# Altium footprint library CONNECTOR HDR.PcbLib: 337 footprints (part 3 of 22)
Each footprint in its own frame and in the unit in brackets; x right, y up, seen from the top. Pads: shape width x height; smd on the part's side, far side on the other; paste and mask are expansions set on the pad; w line width, h text height; cw(c..) or ccw(c..) is an arc to the next point about the centre after c.
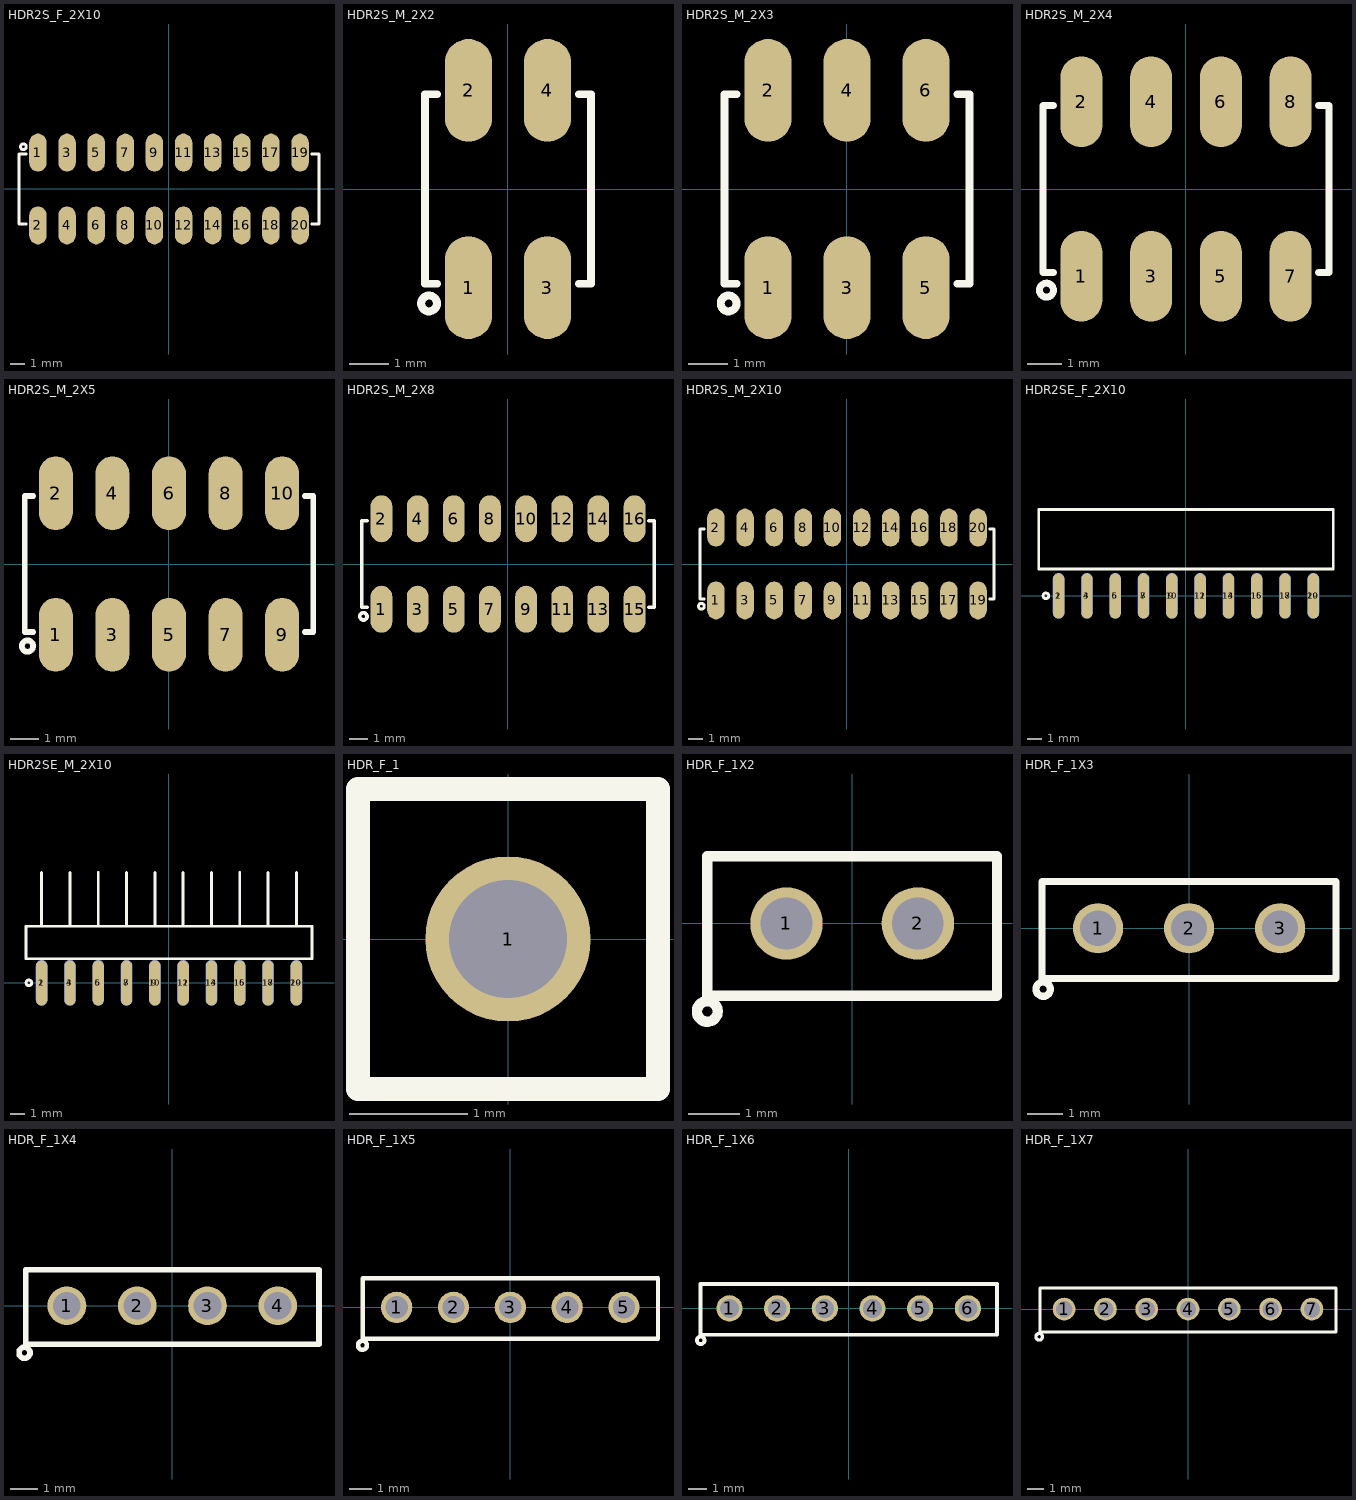
[diagram p2: the footprints below, top view; thin cyan lines are the x and y axes]

## HDR2S_F_2X10 [mm] "Header 2.0mm pitch"
height 1.2
pads (20):
  oval 1.2x2.6 smd mask+0.1: 1(-9,2.5) 2(-9,-2.5) 3(-7,2.5) 4(-7,-2.5) 5(-5,2.5) 6(-5,-2.5) 7(-3,2.5) 8(-3,-2.5) 9(-1,2.5) 10(-1,-2.5) 11(1,2.5) 12(1,-2.5) 13(3,2.5) 14(3,-2.5) 15(5,2.5) 16(5,-2.5) 17(7,2.5) 18(7,-2.5) 19(9,2.5) 20(9,-2.5)
Top Overlay:
  circle w0.2: c-10,2.9 r0.2
  lines w0.2: -9.8,-2.4 -10.3,-2.4 -10.3,2.4 -9.8,2.4 ; 9.8,-2.4 10.3,-2.4 10.3,2.4 9.8,2.4
3D body: height 4.6, standoff 0, extent -10.2,-3.35 10.2,3.351

## HDR2S_M_2X2 [mm] "Header 2.0mm pitch"
pads (4):
  oval 1.2x2.6 smd mask+0.1: 1(-1,-2.5) 2(-1,2.5) 3(1,-2.5) 4(1,2.5)
Top Overlay:
  circle w0.2: c-2,-2.9 r0.2
  lines w0.2: -1.8,-2.4 -2.1,-2.4 -2.1,2.4 -1.8,2.4 ; 1.8,-2.4 2.1,-2.4 2.1,2.4 1.8,2.4
3D body: height 6.5, standoff 0, extent -1.975,-3.25 1.975,3.25

## HDR2S_M_2X3 [mm] "Header 2.0mm pitch"
pads (6):
  oval 1.2x2.6 smd mask+0.1: 1(-2,-2.5) 2(-2,2.5) 3(0,-2.5) 4(0,2.5) 5(2,-2.5) 6(2,2.5)
Top Overlay:
  circle w0.2: c-3,-2.9 r0.2
  lines w0.2: -2.8,-2.4 -3.1,-2.4 -3.1,2.4 -2.8,2.4 ; 2.8,-2.4 3.1,-2.4 3.1,2.4 2.8,2.4
3D body: height 6.5, standoff 0, extent -2.975,-3.25 2.975,3.25

## HDR2S_M_2X4 [mm] "Header 2.0mm pitch"
pads (8):
  oval 1.2x2.6 smd mask+0.1: 1(-3,-2.5) 2(-3,2.5) 3(-1,-2.5) 4(-1,2.5) 5(1,-2.5) 6(1,2.5) 7(3,-2.5) 8(3,2.5)
Top Overlay:
  circle w0.2: c-4,-2.9 r0.2
  lines w0.2: -3.8,-2.4 -4.1,-2.4 -4.1,2.4 -3.8,2.4 ; 3.8,-2.4 4.1,-2.4 4.1,2.4 3.8,2.4
3D body: height 6.5, standoff 0, extent -3.975,-3.25 3.975,3.25

## HDR2S_M_2X5 [mm] "Header 2.0mm pitch"
height 1.2
pads (10):
  oval 1.2x2.6 smd mask+0.1: 1(-4,-2.5) 2(-4,2.5) 3(-2,-2.5) 4(-2,2.5) 5(0,-2.5) 6(0,2.5) 7(2,-2.5) 8(2,2.5) 9(4,-2.5) 10(4,2.5)
Top Overlay:
  circle w0.2: c-5,-2.9 r0.2
  lines w0.2: -4.8,-2.4 -5.1,-2.4 -5.1,2.4 -4.8,2.4 ; 4.8,-2.4 5.1,-2.4 5.1,2.4 4.8,2.4
3D body: height 6.5, standoff 0, extent -0.975,-3.25 4.975,3.25
3D body: height 6.5, standoff 0, extent -4.975,-3.25 -1.025,3.25

## HDR2S_M_2X8 [mm] "Header 2.0mm pitch"
height 1.2
pads (16):
  oval 1.2x2.6 smd mask+0.1: 1(-7,-2.5) 2(-7,2.5) 3(-5,-2.5) 4(-5,2.5) 5(-3,-2.5) 6(-3,2.5) 7(-1,-2.5) 8(-1,2.5) 9(1,-2.5) 10(1,2.5) 11(3,-2.5) 12(3,2.5) 13(5,-2.5) 14(5,2.5) 15(7,-2.5) 16(7,2.5)
Top Overlay:
  circle w0.2: c-8,-2.9 r0.2
  lines w0.2: -7.8,-2.4 -8.1,-2.4 -8.1,2.4 -7.8,2.4 ; 7.8,-2.4 8.1,-2.4 8.1,2.4 7.8,2.4
3D body: height 6.5, standoff 0, extent -7.975,-3.25 7.975,3.25

## HDR2S_M_2X10 [mm] "Header 2.0mm pitch"
height 1.2
pads (20):
  oval 1.2x2.6 smd mask+0.1: 1(-9,-2.5) 2(-9,2.5) 3(-7,-2.5) 4(-7,2.5) 5(-5,-2.5) 6(-5,2.5) 7(-3,-2.5) 8(-3,2.5) 9(-1,-2.5) 10(-1,2.5) 11(1,-2.5) 12(1,2.5) 13(3,-2.5) 14(3,2.5) 15(5,-2.5) 16(5,2.5) 17(7,-2.5) 18(7,2.5) 19(9,-2.5) 20(9,2.5)
Top Overlay:
  circle w0.2: c-10,-2.9 r0.2
  lines w0.2: -9.8,-2.4 -10.1,-2.4 -10.1,2.4 -9.8,2.4 ; 9.8,-2.4 10.1,-2.4 10.1,2.4 9.8,2.4
3D body: height 6.5, standoff 0, extent -9.975,-3.25 9.975,3.25

## HDR2SE_F_2X10 [mm]
height 1.2
pads (20):
  oval 0.8x3.2 smd far side mask+0.1: 1(-9,0) 3(-7,0) 5(-5,0) 7(-3,0) 9(-1,0) 11(1,0) 13(3,0) 15(5,0) 17(7,0) 19(9,0)
  oval 0.8x3.2 smd mask+0.1: 2(-9,0) 4(-7,0) 6(-5,0) 8(-3,0) 10(-1,0) 12(1,0) 14(3,0) 16(5,0) 18(7,0) 20(9,0)
Top Overlay:
  circle w0.2: c-9.9,0 r0.2
  lines w0.2: -10.4,1.9 10.4,1.9 10.4,6.1 -10.4,6.1 -10.4,1.9
3D body: height 2.25, standoff -2.25, extent -10.25,-0.8 10.25,6

## HDR2SE_M_2X10 [mm]
height 1.2
pads (20):
  oval 0.8x3.2 smd mask+0.1: 1(-9,0) 3(-7,0) 5(-5,0) 7(-3,0) 9(-1,0) 11(1,0) 13(3,0) 15(5,0) 17(7,0) 19(9,0)
  oval 0.8x3.2 smd far side mask+0.1: 2(-9,0) 4(-7,0) 6(-5,0) 8(-3,0) 10(-1,0) 12(1,0) 14(3,0) 16(5,0) 18(7,0) 20(9,0)
Top Overlay:
  circle w0.2: c-9.9,0 r0.2
  lines w0.2: -9,4 -9,7.8 ; -7,4 -7,7.8 ; -5,4 -5,7.8 ; -3,4 -3,7.8 ; -1,4 -1,7.8 ; 1,4 1,7.8 ; 3,4 3,7.8 ; 5,4 5,7.8 ; 7,4 7,7.8 ; 9,4 9,7.8 ; -10.1,1.7 10.1,1.7 10.1,4 -10.1,4 -10.1,1.7
3D body: height 2, standoff -2, extent -9.95,-1 9.95,7.8

## HDR_F_1 [mm] "Connector; Header; 1 Position"
height 8
pads (1):
  round 1.4 / inner round 1.4 / far side oval 1.4x2.2 hole 1: 1(0,0)
Top Overlay:
  lines w0.2: -1.27,-1.27 1.27,-1.27 1.27,1.27 -1.27,1.27 -1.27,-1.27
3D body: height 8.5, standoff -3.15, extent -1.27,-1.27 1.27,1.27

## HDR_F_1X2 [mm] "HEADER FEMALE pitch: 2.54mm"
pads (2):
  round 1.4 / inner round 1.4 / far side oval 1.4x2.2 hole 1 mask+0.1: 1(-1.27,0) 2(1.27,0)
Top Overlay:
  circle w0.2: c-2.8,-1.7 r0.2
  lines w0.2: -2.8,-1.4 -2.8,1.3 2.8,1.3 2.8,-1.4 -2.8,-1.4
3D body: height 8.5, standoff -3.2, extent -2.665,-1.3 2.665,1.2

## HDR_F_1X3 [mm] "HEADER FEMALE pitch: 2.54mm"
pads (3):
  round 1.4 / inner round 1.4 / far side oval 1.4x2.2 hole 1 mask+0.1: 1(-2.54,0) 2(0,0) 3(2.54,0)
Top Overlay:
  circle w0.2: c-4.07,-1.7 r0.2
  lines w0.2: -4.1,-1.4 4.1,-1.4 4.1,1.3 -4.1,1.3 -4.1,-1.4
3D body: height 8.5, standoff -3.2, extent -3.935,-1.3 3.935,1.2

## HDR_F_1X4 [mm] "HEADER FEMALE pitch: 2.54mm"
pads (4):
  round 1.4 / inner round 1.4 / far side oval 1.4x2.2 hole 1 mask+0.1: 1(-3.81,0) 2(-1.27,0) 3(1.27,0) 4(3.81,0)
Top Overlay:
  circle w0.2: c-5.34,-1.7 r0.2
  lines w0.2: -5.3,-1.4 -5.3,1.3 5.3,1.3 5.3,-1.4 -5.3,-1.4
3D body: height 8.5, standoff -3.2, extent -5.205,-1.3 0.125,1.2
3D body: height 8.5, standoff -3.2, extent -0.125,-1.3 5.205,1.2

## HDR_F_1X5 [mm] "HEADER FEMALE pitch: 2.54mm"
pads (5):
  round 1.4 / inner round 1.4 / far side oval 1.4x2.2 hole 1 mask+0.1: 1(-5.08,0) 2(-2.54,0) 3(0,0) 4(2.54,0) 5(5.08,0)
Top Overlay:
  circle w0.2: c-6.61,-1.7 r0.2
  lines w0.2: -6.6,-1.4 -6.6,1.3 6.6,1.3 6.6,-1.4 -6.6,-1.4
3D body: height 8.5, standoff -3.2, extent -6.475,-1.3 1.395,1.2
3D body: height 8.5, standoff -3.2, extent 1.145,-1.3 6.475,1.2

## HDR_F_1X6 [mm] "HEADER FEMALE pitch: 2.54mm"
pads (6):
  round 1.4 / inner round 1.4 / far side oval 1.4x2.2 hole 1 mask+0.1: 1(-6.35,0) 2(-3.81,0) 3(-1.27,0) 4(1.27,0) 5(3.81,0) 6(6.35,0)
Top Overlay:
  circle w0.2: c-7.88,-1.7 r0.2
  lines w0.2: -7.9,-1.4 -7.9,1.3 7.9,1.3 7.9,-1.4 -7.9,-1.4
3D body: height 8.5, standoff -3.2, extent -7.745,-1.3 0.125,1.2
3D body: height 8.5, standoff -3.2, extent -0.125,-1.3 7.745,1.2

## HDR_F_1X7 [mm] "HEADER FEMALE pitch: 2.54mm"
pads (7):
  round 1.4 / inner round 1.4 / far side oval 1.4x2.2 hole 1 mask+0.1: 1(-7.62,0) 2(-5.08,0) 3(-2.54,0) 4(0,0) 5(2.54,0) 6(5.08,0) 7(7.62,0)
Top Overlay:
  circle w0.2: c-9.15,-1.7 r0.2
  lines w0.2: -9.1,-1.4 -9.1,1.3 9.1,1.3 9.1,-1.4 -9.1,-1.4
3D body: height 8.5, standoff -3.2, extent 3.685,-1.3 9.015,1.2
3D body: height 8.5, standoff -3.2, extent -9.015,-1.3 -1.145,1.2
3D body: height 8.5, standoff -3.2, extent -1.395,-1.3 3.935,1.2